# Altium schematic symbol library TI Amplifiers and Linear Special Function Amplifier.SchLib: 708 symbols (part 7 of 34)
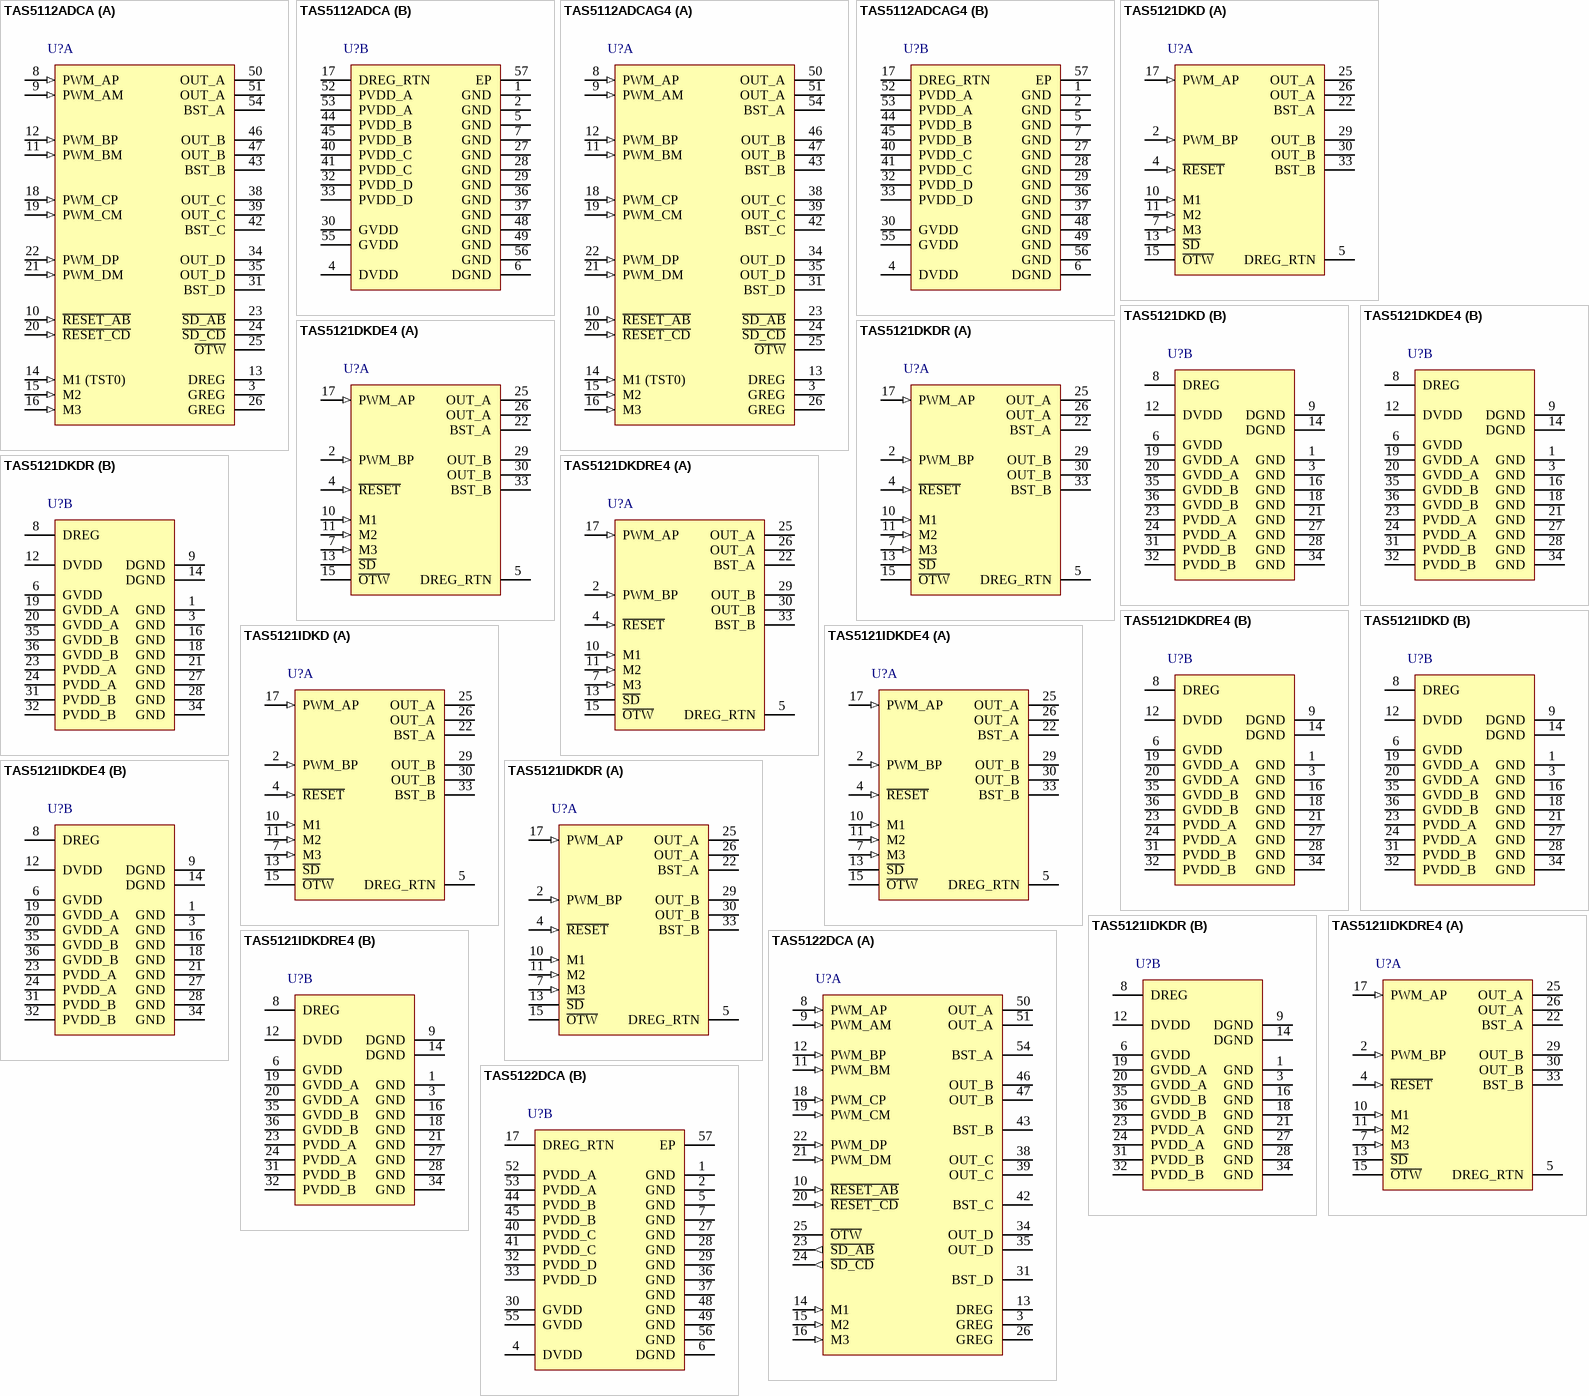
[diagram p45: symbols TAS5112ADCA to TAS5122DCA]

## TAS5121DKD
designator U?
100 W Mono Digital Amplifier Power Stage, 0 to 70 degC, 36-pin SOP (DKD36); Manufacturer: Texas Instruments; PartNumber: TAS5121DKD; Analog Supply Max [V]: 13.2; Analog Supply Min [V]: 10.8; Digital Supply Min [V]: 3; Input Type: PWM; Max. Number of Speaker Outputs: 1; SubFamily: Mid/High-Power Amplifier; DatasheetVersion: SLES086A; PackageVersion: 4204421-2/K, 06/2012; PackageReference: DKD36; PackageDescription: 36-Pin Plastic Small Outline, Body 15.9 x 11 mm, Pitch 0.65 mm; Supplier 1: Digi-Key; Supplier Part Number 1: 296-16644-5-ND; Supplier 2: Newark; Supplier Part Number 2: 90H4508; Supplier 3: Mouser; Supplier Part Number 3: 595-TAS5121DKD; Mounting Technology: Surface Mount; ComponentLink1Description: Manufacturer URL; ComponentLink1URL: http://www.ti.com/; ComponentLink2Description: Datasheet; ComponentLink2URL: http://www.ti.com/general/docs/lit/getliterature.tsp?genericPartNumber=TAS5121&fileType=pdf; ComponentLink3Description: Package Specification; ComponentLink3URL: http://www.ti.com/lit/ds/symlink/tas5121i.pdf
footprint TI-DKD36_N (SOP, 36-Leads, Body 16x11.1mm, Pitch 0.65mm, IPC Medium Density)
footprint TI-DKD36_L (SOP, 36-Leads, Body 16x11.1mm, Pitch 0.65mm, IPC High Density)
footprint TI-DKD36_M (SOP, 36-Leads, Body 16x11.1mm, Pitch 0.65mm, IPC Low Density)
part A pins: 2 PWM_BP (in) "PWM input signal, half-bridge B", 4 ~{RESET} (in) "Reset signal, active-low", 5 DREG_RTN "Decoupling return pin", 7 M3 (in) "Output-mode selection pin; connect to GND", 10 M1 (in) "Protection-mode selection pin, connect to GND", 11 M2 (in) "Protection-mode selection pin, connect to DREG", 13 ~{SD} (oc) "Shutdown signal for half-bridges A and B (open-drain with internal pullup)", 15 ~{OTW} (hiz) "Overtemperature warning output, open drain with internal pullup resistor, active-low when temperature exceeds 115 degC", 17 PWM_AP (in) "PWM input signal, half-bridge A", 22 BST_A "High-side bootstrap (BST) supply, external resistor and capacitor to OUT_A required", 25 OUT_A (hiz) "Output, half-bridge A", 26 OUT_A (hiz) "Output, half-bridge A", 29 OUT_B (hiz) "Output, half-bridge B", 30 OUT_B (hiz) "Output, half-bridge B", 33 BST_B "High-side bootstrap (BST) supply, external resistor and capacitor to OUT_B required"
part B pins: 1 GND (power) "Power ground, connected to system GND", 3 GND (power) "Power ground, connected to system GND", 6 GVDD (power) "Local GVDD decoupling pin", 8 DREG (power) "Digital supply-voltage regulator-decoupling pin, 1-uF capacitor connected to DREG_RTN", 9 DGND (power) "I/O reference ground", 12 DVDD (power) "I/O reference supply input: 100 ohm to DREG, decoupled to GND, 0.1-uF capacitor connected to GND", 14 DGND (power) "I/O reference ground", 16 GND (power) "Power ground, connected to system GND", 18 GND (power) "Power ground, connected to system GND", 19 GVDD_A (power) "Gate-drive input voltage", 20 GVDD_A (power) "Gate-drive input voltage", 21 GND (power) "Power ground, connected to system GND", 23 PVDD_A (power) "Power supply input for half-bridge A", 24 PVDD_A (power) "Power supply input for half-bridge A", 27 GND (power) "Power ground, connected to system GND", 28 GND (power) "Power ground, connected to system GND", 31 PVDD_B (power) "Power supply input for half-bridge B", 32 PVDD_B (power) "Power supply input for half-bridge B", 34 GND (power) "Power ground, connected to system GND", 35 GVDD_B (power) "Gate-drive input voltage", 36 GVDD_B (power) "Gate-drive input voltage"

## TAS5121DKDE4
designator U?
100 W Mono Digital Amplifier Power Stage, 0 to 70 degC, 36-pin SOP (DKD36); Manufacturer: Texas Instruments; PartNumber: TAS5121DKDE4; Analog Supply Max [V]: 13.2; Analog Supply Min [V]: 10.8; Digital Supply Min [V]: 3; Input Type: PWM; Max. Number of Speaker Outputs: 1; SubFamily: Mid/High-Power Amplifier; DatasheetVersion: SLES086A; PackageVersion: 4204421-2/K, 06/2012; PackageReference: DKD36; PackageDescription: 36-Pin Plastic Small Outline, Body 15.9 x 11 mm, Pitch 0.65 mm; Supplier 1: Digi-Key; Supplier Part Number 1: TAS5121DKDE4-ND; Supplier 2: Mouser; Supplier Part Number 2: 595-TAS5121DKDE4; Mounting Technology: Surface Mount; ComponentLink1Description: Manufacturer URL; ComponentLink1URL: http://www.ti.com/; ComponentLink2Description: Datasheet; ComponentLink2URL: http://www.ti.com/general/docs/lit/getliterature.tsp?genericPartNumber=TAS5121&fileType=pdf; ComponentLink3Description: Package Specification; ComponentLink3URL: http://www.ti.com/lit/ds/symlink/tas5121i.pdf
footprint TI-DKD36_N (SOP, 36-Leads, Body 16x11.1mm, Pitch 0.65mm, IPC Medium Density)
footprint TI-DKD36_L (SOP, 36-Leads, Body 16x11.1mm, Pitch 0.65mm, IPC High Density)
footprint TI-DKD36_M (SOP, 36-Leads, Body 16x11.1mm, Pitch 0.65mm, IPC Low Density)
part A pins: 2 PWM_BP (in) "PWM input signal, half-bridge B", 4 ~{RESET} (in) "Reset signal, active-low", 5 DREG_RTN "Decoupling return pin", 7 M3 (in) "Output-mode selection pin; connect to GND", 10 M1 (in) "Protection-mode selection pin, connect to GND", 11 M2 (in) "Protection-mode selection pin, connect to DREG", 13 ~{SD} (oc) "Shutdown signal for half-bridges A and B (open-drain with internal pullup)", 15 ~{OTW} (hiz) "Overtemperature warning output, open drain with internal pullup resistor, active-low when temperature exceeds 115 degC", 17 PWM_AP (in) "PWM input signal, half-bridge A", 22 BST_A "High-side bootstrap (BST) supply, external resistor and capacitor to OUT_A required", 25 OUT_A (hiz) "Output, half-bridge A", 26 OUT_A (hiz) "Output, half-bridge A", 29 OUT_B (hiz) "Output, half-bridge B", 30 OUT_B (hiz) "Output, half-bridge B", 33 BST_B "High-side bootstrap (BST) supply, external resistor and capacitor to OUT_B required"
part B pins: 1 GND (power) "Power ground, connected to system GND", 3 GND (power) "Power ground, connected to system GND", 6 GVDD (power) "Local GVDD decoupling pin", 8 DREG (power) "Digital supply-voltage regulator-decoupling pin, 1-uF capacitor connected to DREG_RTN", 9 DGND (power) "I/O reference ground", 12 DVDD (power) "I/O reference supply input: 100 ohm to DREG, decoupled to GND, 0.1-uF capacitor connected to GND", 14 DGND (power) "I/O reference ground", 16 GND (power) "Power ground, connected to system GND", 18 GND (power) "Power ground, connected to system GND", 19 GVDD_A (power) "Gate-drive input voltage", 20 GVDD_A (power) "Gate-drive input voltage", 21 GND (power) "Power ground, connected to system GND", 23 PVDD_A (power) "Power supply input for half-bridge A", 24 PVDD_A (power) "Power supply input for half-bridge A", 27 GND (power) "Power ground, connected to system GND", 28 GND (power) "Power ground, connected to system GND", 31 PVDD_B (power) "Power supply input for half-bridge B", 32 PVDD_B (power) "Power supply input for half-bridge B", 34 GND (power) "Power ground, connected to system GND", 35 GVDD_B (power) "Gate-drive input voltage", 36 GVDD_B (power) "Gate-drive input voltage"

## TAS5121DKDR
designator U?
100 W Mono Digital Amplifier Power Stage, 0 to 70 degC, 36-pin SOP (DKD36); Manufacturer: Texas Instruments; PartNumber: TAS5121DKDR; Analog Supply Max [V]: 13.2; Analog Supply Min [V]: 10.8; Digital Supply Min [V]: 3; Input Type: PWM; Max. Number of Speaker Outputs: 1; SubFamily: Mid/High-Power Amplifier; DatasheetVersion: SLES086A; PackageVersion: 4204421-2/K, 06/2012; PackageReference: DKD36; PackageDescription: 36-Pin Plastic Small Outline, Body 15.9 x 11 mm, Pitch 0.65 mm; Supplier 1: Digi-Key; Supplier Part Number 1: TAS5121DKDR-ND; Supplier 2: Newark; Supplier Part Number 2: 90H4509; Supplier 3: Mouser; Supplier Part Number 3: 595-TAS5121DKDR; Mounting Technology: Surface Mount; ComponentLink1Description: Manufacturer URL; ComponentLink1URL: http://www.ti.com/; ComponentLink2Description: Datasheet; ComponentLink2URL: http://www.ti.com/general/docs/lit/getliterature.tsp?genericPartNumber=TAS5121&fileType=pdf; ComponentLink3Description: Package Specification; ComponentLink3URL: http://www.ti.com/lit/ds/symlink/tas5121i.pdf
footprint TI-DKD36_N (SOP, 36-Leads, Body 16x11.1mm, Pitch 0.65mm, IPC Medium Density)
footprint TI-DKD36_L (SOP, 36-Leads, Body 16x11.1mm, Pitch 0.65mm, IPC High Density)
footprint TI-DKD36_M (SOP, 36-Leads, Body 16x11.1mm, Pitch 0.65mm, IPC Low Density)
part A pins: 2 PWM_BP (in) "PWM input signal, half-bridge B", 4 ~{RESET} (in) "Reset signal, active-low", 5 DREG_RTN "Decoupling return pin", 7 M3 (in) "Output-mode selection pin; connect to GND", 10 M1 (in) "Protection-mode selection pin, connect to GND", 11 M2 (in) "Protection-mode selection pin, connect to DREG", 13 ~{SD} (oc) "Shutdown signal for half-bridges A and B (open-drain with internal pullup)", 15 ~{OTW} (hiz) "Overtemperature warning output, open drain with internal pullup resistor, active-low when temperature exceeds 115 degC", 17 PWM_AP (in) "PWM input signal, half-bridge A", 22 BST_A "High-side bootstrap (BST) supply, external resistor and capacitor to OUT_A required", 25 OUT_A (hiz) "Output, half-bridge A", 26 OUT_A (hiz) "Output, half-bridge A", 29 OUT_B (hiz) "Output, half-bridge B", 30 OUT_B (hiz) "Output, half-bridge B", 33 BST_B "High-side bootstrap (BST) supply, external resistor and capacitor to OUT_B required"
part B pins: 1 GND (power) "Power ground, connected to system GND", 3 GND (power) "Power ground, connected to system GND", 6 GVDD (power) "Local GVDD decoupling pin", 8 DREG (power) "Digital supply-voltage regulator-decoupling pin, 1-uF capacitor connected to DREG_RTN", 9 DGND (power) "I/O reference ground", 12 DVDD (power) "I/O reference supply input: 100 ohm to DREG, decoupled to GND, 0.1-uF capacitor connected to GND", 14 DGND (power) "I/O reference ground", 16 GND (power) "Power ground, connected to system GND", 18 GND (power) "Power ground, connected to system GND", 19 GVDD_A (power) "Gate-drive input voltage", 20 GVDD_A (power) "Gate-drive input voltage", 21 GND (power) "Power ground, connected to system GND", 23 PVDD_A (power) "Power supply input for half-bridge A", 24 PVDD_A (power) "Power supply input for half-bridge A", 27 GND (power) "Power ground, connected to system GND", 28 GND (power) "Power ground, connected to system GND", 31 PVDD_B (power) "Power supply input for half-bridge B", 32 PVDD_B (power) "Power supply input for half-bridge B", 34 GND (power) "Power ground, connected to system GND", 35 GVDD_B (power) "Gate-drive input voltage", 36 GVDD_B (power) "Gate-drive input voltage"

## TAS5121DKDRE4
designator U?
100 W Mono Digital Amplifier Power Stage, 0 to 70 degC, 36-pin SOP (DKD36); Manufacturer: Texas Instruments; PartNumber: TAS5121DKDRE4; Analog Supply Max [V]: 13.2; Analog Supply Min [V]: 10.8; Digital Supply Min [V]: 3; Input Type: PWM; Max. Number of Speaker Outputs: 1; SubFamily: Mid/High-Power Amplifier; DatasheetVersion: SLES086A; PackageVersion: 4204421-2/K, 06/2012; PackageReference: DKD36; PackageDescription: 36-Pin Plastic Small Outline, Body 15.9 x 11 mm, Pitch 0.65 mm; Supplier 1: Digi-Key; Supplier Part Number 1: TAS5121DKDRE4-ND; Supplier 2: Newark; Supplier Part Number 2: 28M7691; Supplier 3: Mouser; Supplier Part Number 3: 595-TAS5121DKDRE4; Mounting Technology: Surface Mount; ComponentLink1Description: Manufacturer URL; ComponentLink1URL: http://www.ti.com/; ComponentLink2Description: Datasheet; ComponentLink2URL: http://www.ti.com/general/docs/lit/getliterature.tsp?genericPartNumber=TAS5121&fileType=pdf; ComponentLink3Description: Package Specification; ComponentLink3URL: http://www.ti.com/lit/ds/symlink/tas5121i.pdf
footprint TI-DKD36_N (SOP, 36-Leads, Body 16x11.1mm, Pitch 0.65mm, IPC Medium Density)
footprint TI-DKD36_L (SOP, 36-Leads, Body 16x11.1mm, Pitch 0.65mm, IPC High Density)
footprint TI-DKD36_M (SOP, 36-Leads, Body 16x11.1mm, Pitch 0.65mm, IPC Low Density)
part A pins: 2 PWM_BP (in) "PWM input signal, half-bridge B", 4 ~{RESET} (in) "Reset signal, active-low", 5 DREG_RTN "Decoupling return pin", 7 M3 (in) "Output-mode selection pin; connect to GND", 10 M1 (in) "Protection-mode selection pin, connect to GND", 11 M2 (in) "Protection-mode selection pin, connect to DREG", 13 ~{SD} (oc) "Shutdown signal for half-bridges A and B (open-drain with internal pullup)", 15 ~{OTW} (hiz) "Overtemperature warning output, open drain with internal pullup resistor, active-low when temperature exceeds 115 degC", 17 PWM_AP (in) "PWM input signal, half-bridge A", 22 BST_A "High-side bootstrap (BST) supply, external resistor and capacitor to OUT_A required", 25 OUT_A (hiz) "Output, half-bridge A", 26 OUT_A (hiz) "Output, half-bridge A", 29 OUT_B (hiz) "Output, half-bridge B", 30 OUT_B (hiz) "Output, half-bridge B", 33 BST_B "High-side bootstrap (BST) supply, external resistor and capacitor to OUT_B required"
part B pins: 1 GND (power) "Power ground, connected to system GND", 3 GND (power) "Power ground, connected to system GND", 6 GVDD (power) "Local GVDD decoupling pin", 8 DREG (power) "Digital supply-voltage regulator-decoupling pin, 1-uF capacitor connected to DREG_RTN", 9 DGND (power) "I/O reference ground", 12 DVDD (power) "I/O reference supply input: 100 ohm to DREG, decoupled to GND, 0.1-uF capacitor connected to GND", 14 DGND (power) "I/O reference ground", 16 GND (power) "Power ground, connected to system GND", 18 GND (power) "Power ground, connected to system GND", 19 GVDD_A (power) "Gate-drive input voltage", 20 GVDD_A (power) "Gate-drive input voltage", 21 GND (power) "Power ground, connected to system GND", 23 PVDD_A (power) "Power supply input for half-bridge A", 24 PVDD_A (power) "Power supply input for half-bridge A", 27 GND (power) "Power ground, connected to system GND", 28 GND (power) "Power ground, connected to system GND", 31 PVDD_B (power) "Power supply input for half-bridge B", 32 PVDD_B (power) "Power supply input for half-bridge B", 34 GND (power) "Power ground, connected to system GND", 35 GVDD_B (power) "Gate-drive input voltage", 36 GVDD_B (power) "Gate-drive input voltage"

## TAS5121IDKD
designator U?
100 W Mono Digital Amplifier Power Stage, -40 to 85 degC, 36-pin SOP (DKD36), Green (RoHS & no Sb/Br); Manufacturer: Texas Instruments; PartNumber: TAS5121IDKD; Analog Supply Max [V]: 13.2; Analog Supply Min [V]: 10.8; Digital Supply Min [V]: 3; Input Type: PWM; Max. Number of Speaker Outputs: 1; SubFamily: Mid/High-Power Amplifier; DatasheetVersion: SLES122; PackageVersion: 4204421-2/K, 06/2012; PackageReference: DKD36; PackageDescription: 36-Pin Plastic Small Outline, Body 15.9 x 11 mm, Pitch 0.65 mm; Supplier 1: Digi-Key; Supplier Part Number 1: 296-17474-5-ND; Supplier 2: Newark; Supplier Part Number 2: 65J6815; Supplier 3: Mouser; Supplier Part Number 3: 595-TAS5121IDKD; Eco-Plan: Green (RoHS & no Sb/Br); Mounting Technology: Surface Mount; ComponentLink1Description: Manufacturer URL; ComponentLink1URL: http://www.ti.com/; ComponentLink2Description: Datasheet; ComponentLink2URL: http://www.ti.com/general/docs/lit/getliterature.tsp?genericPartNumber=TAS5121I&fileType=pdf; ComponentLink3Description: Package Specification; ComponentLink3URL: http://www.ti.com/lit/ds/symlink/tas5121i.pdf
footprint TI-DKD36_N (SOP, 36-Leads, Body 16x11.1mm, Pitch 0.65mm, IPC Medium Density)
footprint TI-DKD36_L (SOP, 36-Leads, Body 16x11.1mm, Pitch 0.65mm, IPC High Density)
footprint TI-DKD36_M (SOP, 36-Leads, Body 16x11.1mm, Pitch 0.65mm, IPC Low Density)
part A pins: 2 PWM_BP (in) "PWM input signal, half-bridge B", 4 ~{RESET} (in) "Reset signal, active-low", 5 DREG_RTN (power) "Decoupling return pin", 7 M3 (in) "Output-mode selection pin; connect to GND", 10 M1 (in) "Protection-mode selection pin, connect to GND", 11 M2 (in) "Protection-mode selection pin, connect to DREG", 13 ~{SD} (oc) "Shutdown signal for half-bridges A and B (open-drain with internal pullup)", 15 ~{OTW} (hiz) "Overtemperature warning output, open-drain with internal pullup, asserted low when temperature exceeds 115 degC", 17 PWM_AP (in) "PWM input signal, half-bridge A", 22 BST_A "High-side bootstrap (BST) supply, external resistor and capacitor to OUT_A required", 25 OUT_A (hiz) "Output, half-bridge A", 26 OUT_A (hiz) "Output, half-bridge A", 29 OUT_B (hiz) "Output, half-bridge B", 30 OUT_B (hiz) "Output, half-bridge B", 33 BST_B "High-side bootstrap (BST) supply, external resistor and capacitor to OUT_B required"
part B pins: 1 GND (power) "Power ground, connected to system GND", 3 GND (power) "Power ground, connected to system GND", 6 GVDD (power) "Local GVDD decoupling pin", 8 DREG (power) "Digital supply-voltage regulator-decoupling pin, 1-uF capacitor connected to DREG_RTN", 9 DGND (power) "I/O reference ground", 12 DVDD (power) "I/O reference supply input: 100 ohm to DREG, decoupled to GND, 0.1-uF capacitor connected to GND", 14 DGND (power) "I/O reference ground", 16 GND (power) "Power ground, connected to system GND", 18 GND (power) "Power ground, connected to system GND", 19 GVDD_A (power) "Gate-drive input voltage", 20 GVDD_A (power) "Gate-drive input voltage", 21 GND (power) "Power ground, connected to system GND", 23 PVDD_A (power) "Power supply input for half-bridge A", 24 PVDD_A (power) "Power supply input for half-bridge A", 27 GND (power) "Power ground, connected to system GND", 28 GND (power) "Power ground, connected to system GND", 31 PVDD_B (power) "Power supply input for half-bridge B", 32 PVDD_B (power) "Power supply input for half-bridge B", 34 GND (power) "Power ground, connected to system GND", 35 GVDD_B (power) "Gate-drive input voltage", 36 GVDD_B (power) "Gate-drive input voltage"

## TAS5121IDKDE4
designator U?
100 W Mono Digital Amplifier Power Stage, -40 to 85 degC, 36-pin SOP (DKD36), Green (RoHS & no Sb/Br); Manufacturer: Texas Instruments; PartNumber: TAS5121IDKDE4; Analog Supply Max [V]: 13.2; Analog Supply Min [V]: 10.8; Digital Supply Min [V]: 3; Input Type: PWM; Max. Number of Speaker Outputs: 1; SubFamily: Mid/High-Power Amplifier; DatasheetVersion: SLES122; PackageVersion: 4204421-2/K, 06/2012; PackageReference: DKD36; PackageDescription: 36-Pin Plastic Small Outline, Body 15.9 x 11 mm, Pitch 0.65 mm; Supplier 1: Digi-Key; Supplier Part Number 1: TAS5121IDKDE4-ND; Supplier 2: Mouser; Supplier Part Number 2: 595-TAS5121IDKDE4; Eco-Plan: Green (RoHS & no Sb/Br); Mounting Technology: Surface Mount; ComponentLink1Description: Manufacturer URL; ComponentLink1URL: http://www.ti.com/; ComponentLink2Description: Datasheet; ComponentLink2URL: http://www.ti.com/general/docs/lit/getliterature.tsp?genericPartNumber=TAS5121I&fileType=pdf; ComponentLink3Description: Package Specification; ComponentLink3URL: http://www.ti.com/lit/ds/symlink/tas5121i.pdf
footprint TI-DKD36_N (SOP, 36-Leads, Body 16x11.1mm, Pitch 0.65mm, IPC Medium Density)
footprint TI-DKD36_L (SOP, 36-Leads, Body 16x11.1mm, Pitch 0.65mm, IPC High Density)
footprint TI-DKD36_M (SOP, 36-Leads, Body 16x11.1mm, Pitch 0.65mm, IPC Low Density)
part A pins: 2 PWM_BP (in) "PWM input signal, half-bridge B", 4 ~{RESET} (in) "Reset signal, active-low", 5 DREG_RTN (power) "Decoupling return pin", 7 M3 (in) "Output-mode selection pin; connect to GND", 10 M1 (in) "Protection-mode selection pin, connect to GND", 11 M2 (in) "Protection-mode selection pin, connect to DREG", 13 ~{SD} (oc) "Shutdown signal for half-bridges A and B (open-drain with internal pullup)", 15 ~{OTW} (hiz) "Overtemperature warning output, open-drain with internal pullup, asserted low when temperature exceeds 115 degC", 17 PWM_AP (in) "PWM input signal, half-bridge A", 22 BST_A "High-side bootstrap (BST) supply, external resistor and capacitor to OUT_A required", 25 OUT_A (hiz) "Output, half-bridge A", 26 OUT_A (hiz) "Output, half-bridge A", 29 OUT_B (hiz) "Output, half-bridge B", 30 OUT_B (hiz) "Output, half-bridge B", 33 BST_B "High-side bootstrap (BST) supply, external resistor and capacitor to OUT_B required"
part B pins: 1 GND (power) "Power ground, connected to system GND", 3 GND (power) "Power ground, connected to system GND", 6 GVDD (power) "Local GVDD decoupling pin", 8 DREG (power) "Digital supply-voltage regulator-decoupling pin, 1-uF capacitor connected to DREG_RTN", 9 DGND (power) "I/O reference ground", 12 DVDD (power) "I/O reference supply input: 100 ohm to DREG, decoupled to GND, 0.1-uF capacitor connected to GND", 14 DGND (power) "I/O reference ground", 16 GND (power) "Power ground, connected to system GND", 18 GND (power) "Power ground, connected to system GND", 19 GVDD_A (power) "Gate-drive input voltage", 20 GVDD_A (power) "Gate-drive input voltage", 21 GND (power) "Power ground, connected to system GND", 23 PVDD_A (power) "Power supply input for half-bridge A", 24 PVDD_A (power) "Power supply input for half-bridge A", 27 GND (power) "Power ground, connected to system GND", 28 GND (power) "Power ground, connected to system GND", 31 PVDD_B (power) "Power supply input for half-bridge B", 32 PVDD_B (power) "Power supply input for half-bridge B", 34 GND (power) "Power ground, connected to system GND", 35 GVDD_B (power) "Gate-drive input voltage", 36 GVDD_B (power) "Gate-drive input voltage"

## TAS5121IDKDR
designator U?
100 W Mono Digital Amplifier Power Stage, -40 to 85 degC, 36-pin SOP (DKD36), Green (RoHS & no Sb/Br); Manufacturer: Texas Instruments; PartNumber: TAS5121IDKDR; Analog Supply Max [V]: 13.2; Analog Supply Min [V]: 10.8; Digital Supply Min [V]: 3; Input Type: PWM; Max. Number of Speaker Outputs: 1; SubFamily: Mid/High-Power Amplifier; DatasheetVersion: SLES122; PackageVersion: 4204421-2/K, 06/2012; PackageReference: DKD36; PackageDescription: 36-Pin Plastic Small Outline, Body 15.9 x 11 mm, Pitch 0.65 mm; Supplier 1: Digi-Key; Supplier Part Number 1: TAS5121IDKDR-ND; Supplier 2: Mouser; Supplier Part Number 2: 595-TAS5121IDKDR; Eco-Plan: Green (RoHS & no Sb/Br); Mounting Technology: Surface Mount; ComponentLink1Description: Manufacturer URL; ComponentLink1URL: http://www.ti.com/; ComponentLink2Description: Datasheet; ComponentLink2URL: http://www.ti.com/general/docs/lit/getliterature.tsp?genericPartNumber=TAS5121I&fileType=pdf; ComponentLink3Description: Package Specification; ComponentLink3URL: http://www.ti.com/lit/ds/symlink/tas5121i.pdf
footprint TI-DKD36_N (SOP, 36-Leads, Body 16x11.1mm, Pitch 0.65mm, IPC Medium Density)
footprint TI-DKD36_L (SOP, 36-Leads, Body 16x11.1mm, Pitch 0.65mm, IPC High Density)
footprint TI-DKD36_M (SOP, 36-Leads, Body 16x11.1mm, Pitch 0.65mm, IPC Low Density)
part A pins: 2 PWM_BP (in) "PWM input signal, half-bridge B", 4 ~{RESET} (in) "Reset signal, active-low", 5 DREG_RTN (power) "Decoupling return pin", 7 M3 (in) "Output-mode selection pin; connect to GND", 10 M1 (in) "Protection-mode selection pin, connect to GND", 11 M2 (in) "Protection-mode selection pin, connect to DREG", 13 ~{SD} (oc) "Shutdown signal for half-bridges A and B (open-drain with internal pullup)", 15 ~{OTW} (hiz) "Overtemperature warning output, open-drain with internal pullup, asserted low when temperature exceeds 115 degC", 17 PWM_AP (in) "PWM input signal, half-bridge A", 22 BST_A "High-side bootstrap (BST) supply, external resistor and capacitor to OUT_A required", 25 OUT_A (hiz) "Output, half-bridge A", 26 OUT_A (hiz) "Output, half-bridge A", 29 OUT_B (hiz) "Output, half-bridge B", 30 OUT_B (hiz) "Output, half-bridge B", 33 BST_B "High-side bootstrap (BST) supply, external resistor and capacitor to OUT_B required"
part B pins: 1 GND (power) "Power ground, connected to system GND", 3 GND (power) "Power ground, connected to system GND", 6 GVDD (power) "Local GVDD decoupling pin", 8 DREG (power) "Digital supply-voltage regulator-decoupling pin, 1-uF capacitor connected to DREG_RTN", 9 DGND (power) "I/O reference ground", 12 DVDD (power) "I/O reference supply input: 100 ohm to DREG, decoupled to GND, 0.1-uF capacitor connected to GND", 14 DGND (power) "I/O reference ground", 16 GND (power) "Power ground, connected to system GND", 18 GND (power) "Power ground, connected to system GND", 19 GVDD_A (power) "Gate-drive input voltage", 20 GVDD_A (power) "Gate-drive input voltage", 21 GND (power) "Power ground, connected to system GND", 23 PVDD_A (power) "Power supply input for half-bridge A", 24 PVDD_A (power) "Power supply input for half-bridge A", 27 GND (power) "Power ground, connected to system GND", 28 GND (power) "Power ground, connected to system GND", 31 PVDD_B (power) "Power supply input for half-bridge B", 32 PVDD_B (power) "Power supply input for half-bridge B", 34 GND (power) "Power ground, connected to system GND", 35 GVDD_B (power) "Gate-drive input voltage", 36 GVDD_B (power) "Gate-drive input voltage"

## TAS5121IDKDRE4
designator U?
100 W Mono Digital Amplifier Power Stage, -40 to 85 degC, 36-pin SOP (DKD36), Green (RoHS & no Sb/Br); Manufacturer: Texas Instruments; PartNumber: TAS5121IDKDRE4; Analog Supply Max [V]: 13.2; Analog Supply Min [V]: 10.8; Digital Supply Min [V]: 3; Input Type: PWM; Max. Number of Speaker Outputs: 1; SubFamily: Mid/High-Power Amplifier; DatasheetVersion: SLES122; PackageVersion: 4204421-2/K, 06/2012; PackageReference: DKD36; PackageDescription: 36-Pin Plastic Small Outline, Body 15.9 x 11 mm, Pitch 0.65 mm; Supplier 1: Digi-Key; Supplier Part Number 1: TAS5121IDKDRE4-ND; Supplier 2: Mouser; Supplier Part Number 2: 595-TAS5121IDKDRE4; Eco-Plan: Green (RoHS & no Sb/Br); Mounting Technology: Surface Mount; ComponentLink1Description: Manufacturer URL; ComponentLink1URL: http://www.ti.com/; ComponentLink2Description: Datasheet; ComponentLink2URL: http://www.ti.com/general/docs/lit/getliterature.tsp?genericPartNumber=TAS5121I&fileType=pdf; ComponentLink3Description: Package Specification; ComponentLink3URL: http://www.ti.com/lit/ds/symlink/tas5121i.pdf
footprint TI-DKD36_N (SOP, 36-Leads, Body 16x11.1mm, Pitch 0.65mm, IPC Medium Density)
footprint TI-DKD36_L (SOP, 36-Leads, Body 16x11.1mm, Pitch 0.65mm, IPC High Density)
footprint TI-DKD36_M (SOP, 36-Leads, Body 16x11.1mm, Pitch 0.65mm, IPC Low Density)
part A pins: 2 PWM_BP (in) "PWM input signal, half-bridge B", 4 ~{RESET} (in) "Reset signal, active-low", 5 DREG_RTN (power) "Decoupling return pin", 7 M3 (in) "Output-mode selection pin; connect to GND", 10 M1 (in) "Protection-mode selection pin, connect to GND", 11 M2 (in) "Protection-mode selection pin, connect to DREG", 13 ~{SD} (oc) "Shutdown signal for half-bridges A and B (open-drain with internal pullup)", 15 ~{OTW} (hiz) "Overtemperature warning output, open-drain with internal pullup, asserted low when temperature exceeds 115 degC", 17 PWM_AP (in) "PWM input signal, half-bridge A", 22 BST_A "High-side bootstrap (BST) supply, external resistor and capacitor to OUT_A required", 25 OUT_A (hiz) "Output, half-bridge A", 26 OUT_A (hiz) "Output, half-bridge A", 29 OUT_B (hiz) "Output, half-bridge B", 30 OUT_B (hiz) "Output, half-bridge B", 33 BST_B "High-side bootstrap (BST) supply, external resistor and capacitor to OUT_B required"
part B pins: 1 GND (power) "Power ground, connected to system GND", 3 GND (power) "Power ground, connected to system GND", 6 GVDD (power) "Local GVDD decoupling pin", 8 DREG (power) "Digital supply-voltage regulator-decoupling pin, 1-uF capacitor connected to DREG_RTN", 9 DGND (power) "I/O reference ground", 12 DVDD (power) "I/O reference supply input: 100 ohm to DREG, decoupled to GND, 0.1-uF capacitor connected to GND", 14 DGND (power) "I/O reference ground", 16 GND (power) "Power ground, connected to system GND", 18 GND (power) "Power ground, connected to system GND", 19 GVDD_A (power) "Gate-drive input voltage", 20 GVDD_A (power) "Gate-drive input voltage", 21 GND (power) "Power ground, connected to system GND", 23 PVDD_A (power) "Power supply input for half-bridge A", 24 PVDD_A (power) "Power supply input for half-bridge A", 27 GND (power) "Power ground, connected to system GND", 28 GND (power) "Power ground, connected to system GND", 31 PVDD_B (power) "Power supply input for half-bridge B", 32 PVDD_B (power) "Power supply input for half-bridge B", 34 GND (power) "Power ground, connected to system GND", 35 GVDD_B (power) "Gate-drive input voltage", 36 GVDD_B (power) "Gate-drive input voltage"
